# Altium schematic symbol library THU VIEN SCH.SchLib: 1083 symbols (part 1 of 5) (continued)
## De Pin (continued)
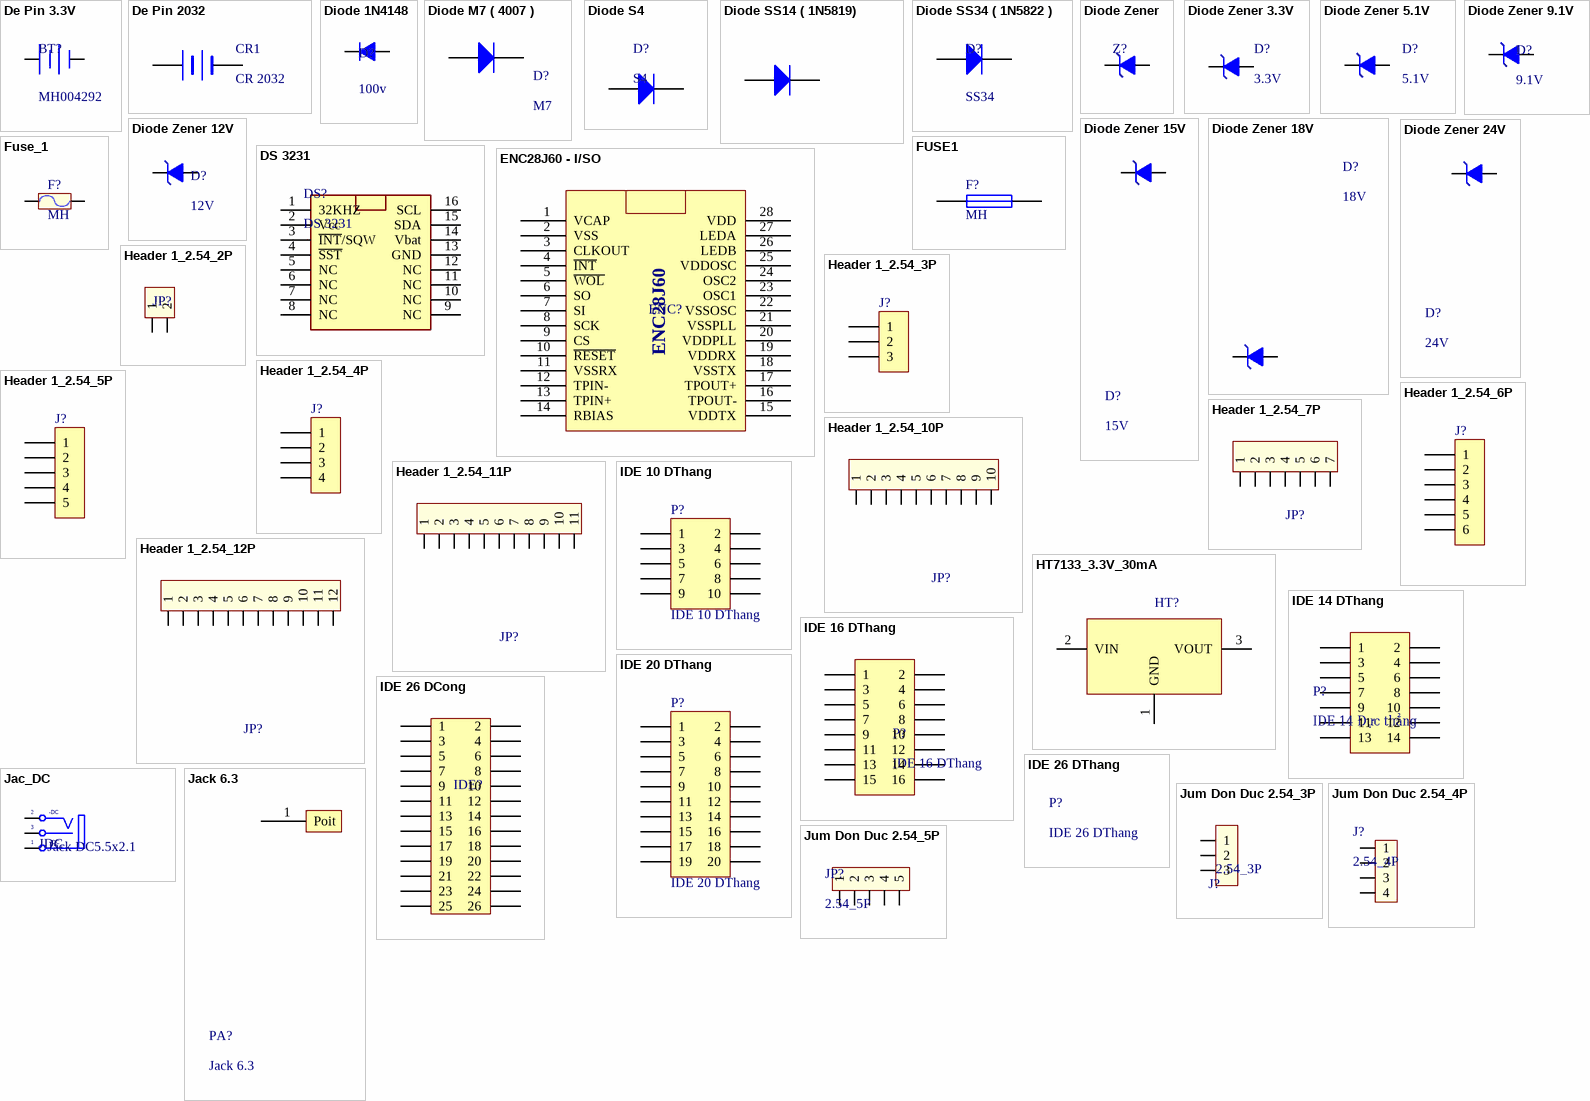
[diagram p3: symbols De Pin 3.3V to Jum Don Duc 2.54_5P]

## De Pin 3.3V
designator BT?, comment MH004292
Dán; LatestRevisionDate: Đế Pin CR2032 SMD003
footprint PIN CR1220
pins: 1 +, 2 -

## De Pin 2032
designator CR1, comment CR 2032
Cắm; Don_Vi: Con; Ma_Hang: MH004286; Ten_Linh_Kien: Đế Pin CR2032 DIP002; Kieu_Chan: *; Ghi_Chu: *; Chung_Loai: Cắm
footprint De Pin CR 2032
pins: 1 -, 2 +

## Diode 1N4148
designator D?, comment 100v
Cắm; Ten_Linh_Kien: Diode 1N4148 DO35 450mA 100V ( 1N4148 DIP); Don_Vi: Con; Ma_Hang: MH001065; Ghi Chu: *; Kieu_Chan: *; Chung_Loai: Cắm
footprint Diode 1N4007 (Diode 2A)
pins: 1 A, 2 K

## Diode M7 ( 4007 )
designator D?, comment M7
Dán; Don_Vi: Con; Ten_Linh_Kien: Diode M7 1N4007 SMD 1A 1000V; Ma_Hang: MH000944; Chung_Loai: Dán; Ghi_Chu: *
footprint DO_SMD_NEW
pins: 1 A, 2 K

## Diode S4
designator D?, comment S4
Dán; Ten_Linh_Kien: Diode S4 SOD123 ( 1N5819 SOD123); Ma_Hang: MH005519; Don_Vi: Con; Ghi_Chu: *; Chung_Loai: Dán; Kieu_Chan: *
footprint DIODE S4
pins: 1 A, 2 K

## Diode SS14 ( 1N5819)
designator D?, comment SS14
Dán; Ma_Hang: MH002211; Don_Vi: Con; Ten_Linh_Kien: Diode SS14 DO214 Schottky 1A 40V ( 1N5819 DO214); Chung_Loai: Dán; Ghi_Chu: *; Kieu_Chan: *
footprint DIODE SMD
pins: 1 A, 2 K

## Diode SS34 ( 1N5822 )
designator D?, comment SS34
Dán; Don_Vi: Con; Ma_Hang: MH002104; Ten_Linh_Kien: Diode SS34 3A 40V SMA ( 1N5822 SS34A); Kieu_Chan: *; Chung_Loai: Dán
footprint DO_SMD_NEW
pins: 1 A, 2 K

## Diode Zener
designator Z?
Dán; Value: Zener; Don_Vi: *; Ghi_Chu: *; Kieu Chan: *; Ma_Hang: *
footprint D1A (Diode 1A, W 100mil, L 350mil)
footprint SMB
pins: 1 A, 2 K

## Diode Zener 3.3V
designator D?, comment 3.3V
Dán; Don_Vi: Con; Ma_Hang: MH002880; Ten_Linh_Kien: Diode Zener 1/2W 3.3V SMD1206 ZMM3.3; Kieu_Chan: *; Ghi_Chu: *; Chung_Loai: Dán
footprint ZENNER SMD
pins: 1 A, 2 K

## Diode Zener 5.1V
designator D?, comment 5.1V
Dán; Ma_Hang: MH002881; Ten_Linh_Kien: Diode Zener 1/2W 5.1V SMD1206 ZMM5.1; Don_Vi: Con; Kieu_Chan: *; Ghi_Chu: *; Chung_Loai: Dán
footprint ZENNER SMD
pins: 1 A, 2 K

## Diode Zener 9.1V
designator D?, comment 9.1V
Dán; Don_Vi: Con; Ma_Hang: MH002882; Ten_Linh_Kien: Diode Zener 1/2W 9.1V SMD1206 ZMM9.1; Ghi_Chu: *; Chung_Loai: Dán; Kieu_Chan: *
footprint ZENNER SMD
pins: 1 A, 2 K

## Diode Zener 12V
designator D?, comment 12V
Dán; Ma_Hang: MH000945; Don_Vi: Con; Ten_Linh_Kien: Diode Zener 1/2W 12V SMD1206 ZMM12; Kieu_Chan: *; Ghi_Chu: *; Chung_Loai: Dán
footprint ZENNER SMD
pins: 1 A, 2 K

## Diode Zener 15V
designator D?, comment 15V
Dán; Don_Vi: Con; Ma_Hang: MH002883; Ten_Linh_Kien: Diode Zener 1/2W 15V SMD1206 ZMM15; Ghi_Chu: *; Chung_Loai: Dán; Kieu_Chan: *
footprint ZENNER SMD
pins: 1 A, 2 K

## Diode Zener 18V
designator D?, comment 18V
Dán; Don_Vi: Con; Ma_Hang: MH002884; Ten_Linh_Kien: Diode Zener 1/2W 18V SMD1206 ZMM18; Chung_Loai: Dán; Ghi_Chu: *; Kieu_Chan: *
footprint ZENNER SMD
pins: 1 A, 2 K

## Diode Zener 24V
designator D?, comment 24V
Cắm; Don_Vi: Con; Ten_Linh_Kien: Diode Zener 1/2W 24V DIP 1N5252B; Ma_Hang: MH002878; Ghi_Chu: *; Kieu_Chan: *; Chung_Loai: Cắm
footprint ZENNER SMD
pins: 1 A, 2 K

## DS 3231
designator DS?
Dán; Ma_Hang: MH002604; Don_Vi: Con; Ten_Linh_Kien: DS3231N SOIC16; Ghi_Chu: *; Chung_Loai: Dán; Kieu_Chan: *
footprint SOP16 (Small Outline; 16 Leads; Body Width 5.6 mm; Pitch 1.27 mm)
footprint SOIC16_M (16-Pin Small Outline Integrated Circuit Package (SOIC16), IPC Low Density)
pins: 1 32KHZ, 2 Vcc, 3 ~{INT}/SQW, 4 ~{SST}, 5 NC, 6 NC, 7 NC, 8 NC, 9 NC, 10 NC, 11 NC, 12 NC, 13 GND, 14 Vbat, 15 SDA, 16 SCL

## ENC28J60 - I/SO
designator ENC?, comment ENC28J60  (value not drawn)
Dán; Value: ENC28J60/SS SSOP28; Don_Vi: Con; Ma_Hang: MH000676; Ghi Chu: *; Kieu Chan: *
footprint SSOP28
pins: 1 VCAP, 2 VSS, 3 CLKOUT, 4 ~{INT}, 5 ~{WOL}, 6 SO, 7 SI, 8 SCK, 9 CS, 10 ~{RESET}, 11 VSSRX, 12 TPIN-, 13 TPIN+, 14 RBIAS, 15 VDDTX, 16 TPOUT-, 17 TPOUT+, 18 VSSTX, 19 VDDRX, 20 VDDPLL, 21 VSSPLL, 22 VSSOSC, 23 OSC1, 24 OSC2, 25 VDDOSC, 26 LEDB, 27 LEDA, 28 VDD

## FUSE1
designator F?, comment MH
Cắm; Value: *
pins: 1, 2

## Fuse_1
designator F?, comment MH
Dán; Value: Fuse
footprint Fuse (3A)
footprint FUSE1 (De Fuse Box)
footprint FUSE2 (Fuse)
footprint CAU TRI (Cau Tri)
pins: 1, 2

## Header 1_2.54_2P
designator JP?
Cắm; Chung_Loai: Cắm
footprint Header_Duc Cong_2P 2.54
pins: 1, 2

## Header 1_2.54_3P
designator J?
Cắm; Ma_Hang: *; Ghi_Chu: *; Don_Vi: *; Kieu_Chan: *; Chung_Loai: Cắm
footprint Header_Duc Cong_3P 2.54
pins: 1, 2, 3

## Header 1_2.54_4P
designator J?
Cắm; Chung_Loai: Cắm
footprint CON4
footprint Header_Duc Cong_4P 2.54
pins: 1, 2, 3, 4

## Header 1_2.54_5P
designator J?
Cắm; Chung_Loai: Cắm
footprint Header_Duc Cong_5P 2.54
pins: 1, 2, 3, 4, 5

## Header 1_2.54_6P
designator J?
Cắm; Don Vi: Con; Chung_Loai: Cắm
footprint Header_Duc Cong_6P 2.54
pins: 1, 2, 3, 4, 5, 6

## Header 1_2.54_7P
designator JP?
Cắm; Don_Vi: Con; Chung_Loai: Cắm
footprint Header_Duc Cong_P 2.54
pins: 1, 2, 3, 4, 5, 6, 7

## Header 1_2.54_10P
designator JP?
Cắm; Don_Vi: Con; Chung_Loai: Cắm
footprint Header_Duc Thang_10P_2.54
pins: 1, 2, 3, 4, 5, 6, 7, 8, 9, 10

## Header 1_2.54_11P
designator JP?
Cắm; Don_Vi: Con; Chung_Loai: Cắm
footprint CON11
pins: 1, 2, 3, 4, 5, 6, 7, 8, 9, 10, 11

## Header 1_2.54_12P
designator JP?
Cắm; Don_Vi: Con; Chung_Loai: Cắm
footprint CON12
pins: 1, 2, 3, 4, 5, 6, 7, 8, 9, 10, 11, 12

## HT7133_3.3V_30mA
designator HT?, comment HT7133 3.3V 30mA  (value not drawn)
footprint SOT89-150P410X160-3N (SOT89, 3-Leads, Body 4.5x2.4mm (max), Pitch 1.50mm, Lead Span 4.1mm, IPC Medium Density)
pins: 1 GND, 2 VIN, 3 VOUT

## IDE 10 DThang
designator P?
Cắm; Don_Vi: Con; Chung_Loai: Cắm; Kieu_Chan: *; Ghi_Chu: *
footprint IDE 10 (Connector; Header; 5x2 Position)
signal-integrity model Connector
pins: 1, 2, 3, 4, 5, 6, 7, 8, 9, 10

## IDE 14 DThang
designator P?, comment IDE 14 Đực thẳng
Cắm; Ghi_Chu: Con; Ma_Hang: MH001326; Ten_Linh_Kien: IDE14 Đực Thẳng 2.54MM; Kieu_Chan: *; Don_Vi: *; Chung_Loai: Cắm
footprint IDE_14P
pins: 1, 2, 3, 4, 5, 6, 7, 8, 9, 10, 11, 12, 13, 14

## IDE 16 DThang
designator P?
Cắm; Don_Vi: Con; Ten_Linh_Kien: *; Kieu_Chan: *; Chung_Loai: Cắm; Ghi_Chu: *; Ma_Hang: *
pins: 1, 2, 3, 4, 5, 6, 7, 8, 9, 10, 11, 12, 13, 14, 15, 16

## IDE 20 DThang
designator P?
Cắm; Don_Vi: Con; Chung_Loai: Cắm; Ma_Hang: *; Kieu_Chan: *; Ghi_Chu: *; Ten_Linh_Kien: *
footprint IDE20 (Connector; Header; 5x2 Position)
signal-integrity model Connector
pins: 1, 2, 3, 4, 5, 6, 7, 8, 9, 10, 11, 12, 13, 14, 15, 16, 17, 18, 19, 20

## IDE 26 DCong
designator IDE?, comment IDE26 Đực Cong 2.54MM  (value not drawn)
Cắm; Don_Vi: Con; Ma_Hang: MH004691; Ten_Linh_Kien: IDE26 Đực Cong 2.54MM; Kieu_Chan: *; Ghi_Chu: *; Chung_Loai: Cắm
pins: 1, 2, 3, 4, 5, 6, 7, 8, 9, 10, 11, 12, 13, 14, 15, 16, 17, 18, 19, 20, 21, 22, 23, 24, 25, 26

## IDE 26 DThang
designator P?
Cắm; Ten_Linh_Kien: IDE26 Đực Thẳng 2.54MM; Don_Vi: Con; Ma_Hang: MH004532; Ghi_Chu: *; Chung_Loai: Cắm; Kieu_Chan: *
footprint IDE 26

## Jac_DC
designator JDC, comment Jack DC5.5x2.1
Cắm; Ten_Linh_Kien: Jack DC5.5x2.1MM DC5501; Ma_Hang: MH000923; Don_Vi: Con; Kieu_Chan: *; Ghi_Chu: *; Chung_Loai: Cắm
footprint DC-IN (Jac DC input)
pins: 1 T "Tip", 2 TN "Tip Normal (Break Contact)", 3 S (power) "Sleeve (Ground)"
text: -DC; +DC

## Jack 6.3
designator PA?
footprint Jack 6.3
pins: 1 Poit

## Jum Don Duc 2.54_3P
designator J?, comment 2.54_3P
Cắm; Ten_Linh_Kien: Jump Đơn Đực 2.54MM 1x40P Thẳng 11MM; Ma_Hang: MH000903; Don_Vi: Con; Kieu_Chan: *; Ghi_Chu: *; Chung_Loai: Cắm
footprint JP3 (Jumper 3)
pins: 1, 2, 3

## Jum Don Duc 2.54_4P
designator J?, comment 2.54_4P
Cắm; Don_Vi: Con; Ma_Hang: MH000903; Value: Jump Đơn Đực 2.54MM 1x40P Thẳng 11MM; Ghi Chu: *; Kieu Chan: *; Chung_Loai: Cắm
footprint JP4 (Jumper 4)
footprint JP4H
pins: 1, 2, 3, 4

## Jum Don Duc 2.54_5P
designator JP?, comment 2.54_5P
Cắm; Ten_Linh_Kien: Jump Đôi Đực 2.54MM 2x40P Thẳng 11MM; Don_Vi: Con; Ma_Hang: MH000903; Kieu_Chan: *; Ghi_Chu: *; Chung_Loai: Cắm
footprint JP5
footprint JP5H
pins: 1, 2, 3, 4, 5

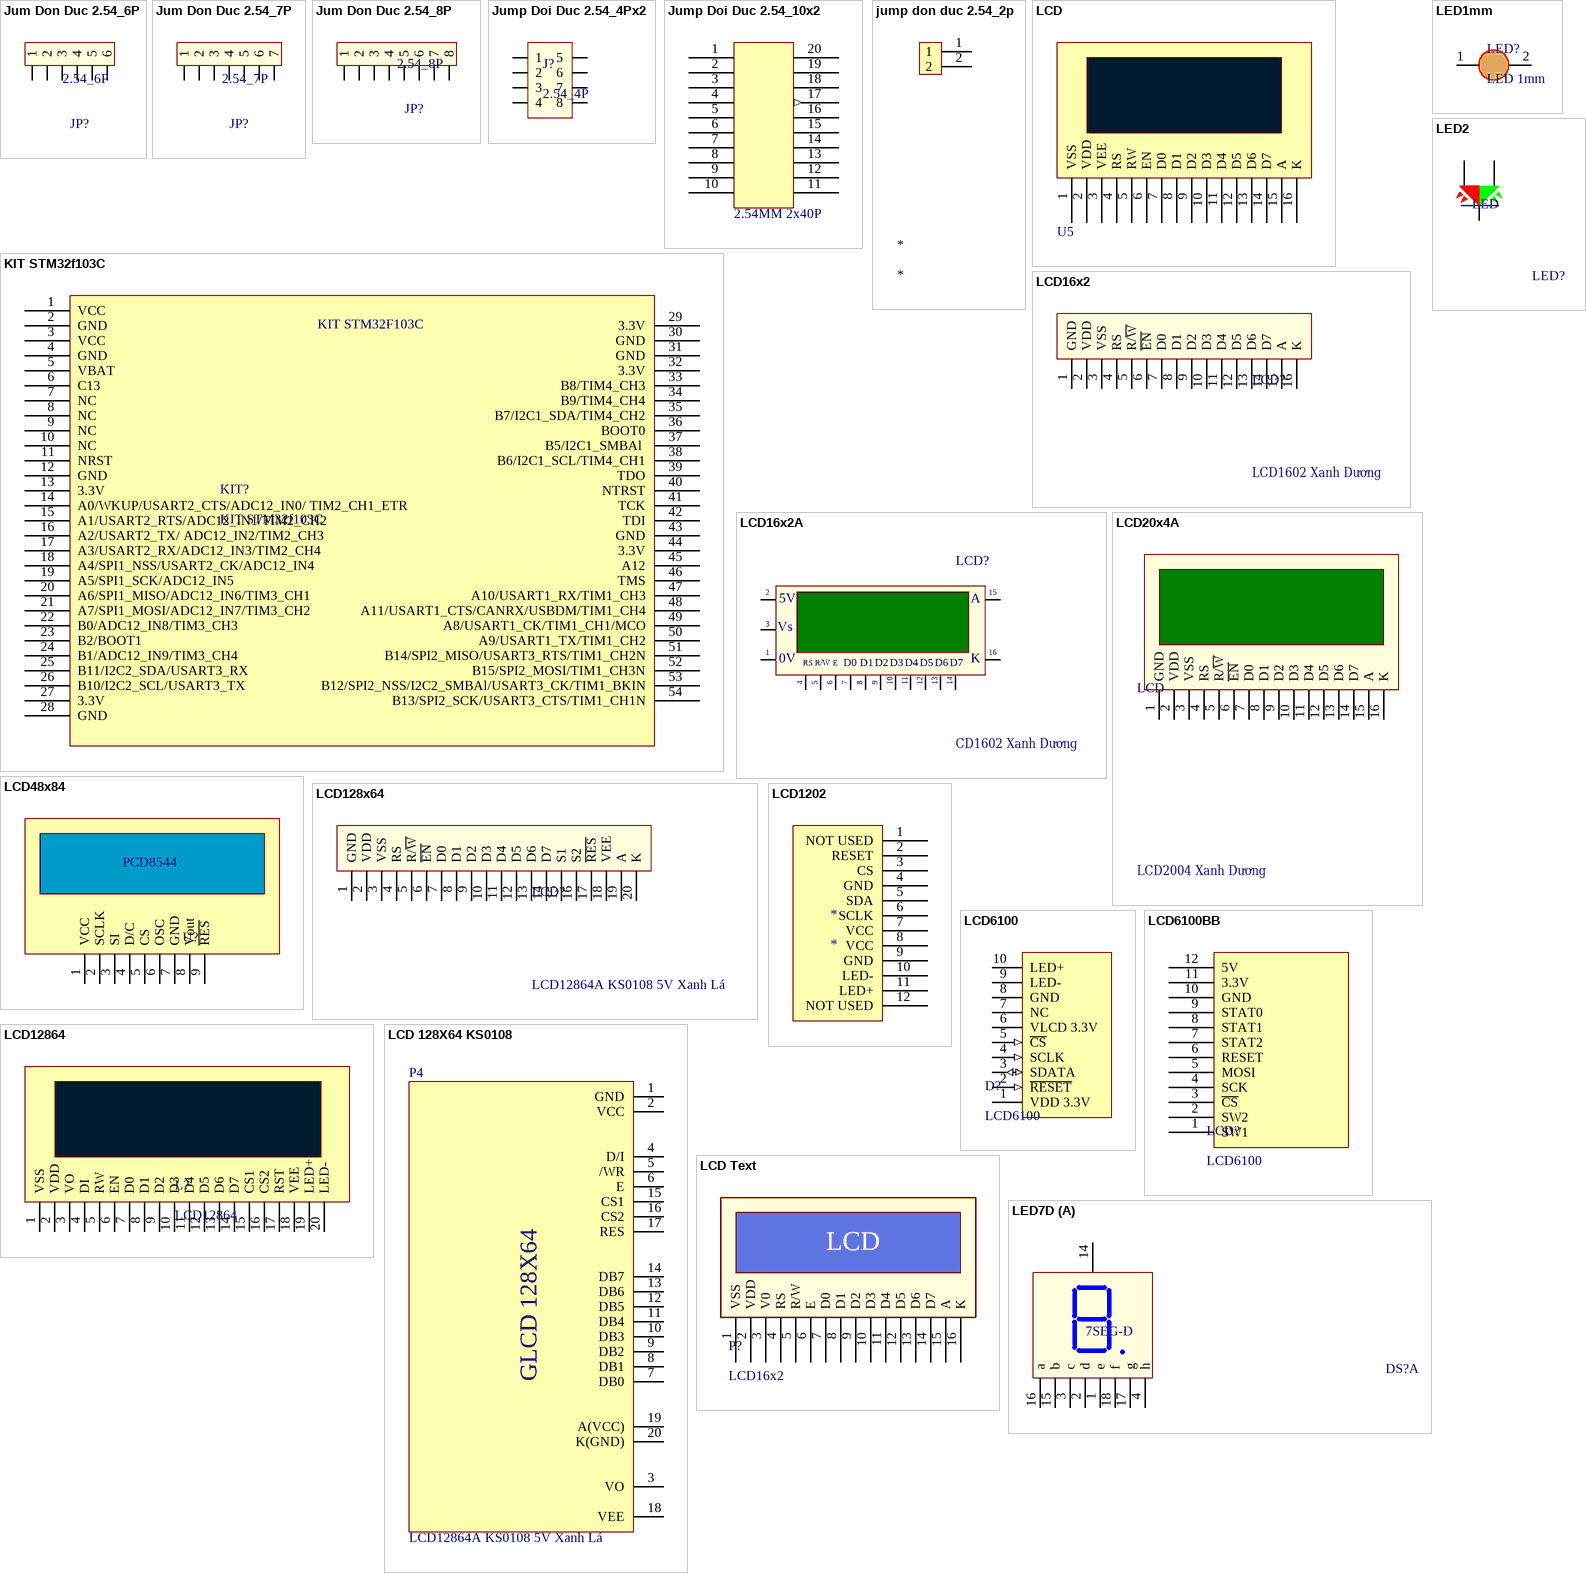
[diagram p4: symbols Jum Don Duc 2.54_6P to LED7D]

## Jum Don Duc 2.54_6P
designator JP?, comment 2.54_6P
Cắm; Ten_Linh_Kien: Jump Đơn Đực 2.54MM 1x40P Thẳng 11MM; Ma_Hang: MH000903; Don_Vi: Con; Kieu_Chan: *; Ghi_Chu: *; Chung_Loai: Cắm
footprint JP6
footprint JP6H
pins: 1, 2, 3, 4, 5, 6

## Jum Don Duc 2.54_7P
designator JP?, comment 2.54_7P
Cắm; Ten_Linh_Kien: Jump Đơn Đực 2.54MM 1x40P Thẳng 11MM; Ma_Hang: MH000903; Don_Vi: Con; Ghi Chu: *; Kieu Chan: *; Chung_Loai: Cắm
footprint JP7
footprint JP7H
pins: 1, 2, 3, 4, 5, 6, 7

## Jum Don Duc 2.54_8P
designator JP?, comment 2.54_8P
Cắm; Value: Jump Đơn Đực 2.54MM 1x40P Thẳng 11MM; Ma_Hang: MH000903; Don_Vi: Con; Ghi_Chu: *; Kieu Chan: *; Chung_Loai: Cắm
footprint JP8
footprint JP8H
pins: 1, 2, 3, 4, 5, 6, 7, 8

## Jump Doi Duc 2.54_4Px2
designator J?, comment 2.54_4P
Cắm; Ten_Linh_Kien: Jump Đơn Đực 2.54MM 1x40P Thẳng 11MM; Ma_Hang: MH000903; Don_Vi: Con; Ghi_Chu: *; Kieu_Chan: *; Chung_Loai: Cắm
footprint JP4x2 (Connector 4x2)
pins: 1, 2, 3, 4, 5, 6, 7, 8

## Jump Doi Duc 2.54_10x2
designator JP?, comment 2.54MM 2x40P
Cắm; Ten_Linh_Kien: Jump Đôi Đực 2.54MM 2x40P Thẳng 11MM; Don_Vi: Con; Ma_Hang: MH002686; Ghi_Chu: *; Kieu_Chan: *; Chung_Loai: Cắm
footprint HDR2X10
pins: 1, 2, 3, 4, 5, 6, 7, 8, 9, 10, 11 13, 12 14, 13 15, 14 16, 15 17, 16 18, 17 19 (out), 18 20, 19 21, 20 22

## jump don duc 2.54_2p
designator *
footprint jump don duc_2p
pins: 1, 2

## KIT STM32f103C
designator KIT?
pins: 1 VCC, 2 GND, 3 VCC, 4 GND, 5 VBAT, 6 C13, 7 NC, 8 NC, 9 NC, 10 NC, 11 NRST, 12 GND, 13 3.3V, 14 A0/WKUP/USART2_CTS/ADC12_IN0/ TIM2_CH1_ETR, 15 A1/USART2_RTS/ADC12_IN1/TIM2_CH2, 16 A2/USART2_TX/ ADC12_IN2/TIM2_CH3, 17 A3/USART2_RX/ADC12_IN3/TIM2_CH4, 18 A4/SPI1_NSS/USART2_CK/ADC12_IN4, 19 A5/SPI1_SCK/ADC12_IN5, 20 A6/SPI1_MISO/ADC12_IN6/TIM3_CH1, 21 A7/SPI1_MOSI/ADC12_IN7/TIM3_CH2, 22 B0/ADC12_IN8/TIM3_CH3, 23 B2/BOOT1, 24 B1/ADC12_IN9/TIM3_CH4, 25 B11/I2C2_SDA/USART3_RX, 26 B10/I2C2_SCL/USART3_TX, 27 3.3V, 28 GND, 29 3.3V, 30 GND, 31 GND, 32 3.3V, 33 B8/TIM4_CH3, 34 B9/TIM4_CH4, 35 B7/I2C1_SDA/TIM4_CH2, 36 BOOT0, 37 B5/I2C1_SMBAl , 38 B6/I2C1_SCL/TIM4_CH1, 39 TDO, 40 NTRST, 41 TCK, 42 TDI, 43 GND, 44 3.3V, 45 A12, 46 TMS, 47 A10/USART1_RX/TIM1_CH3, 48 A11/USART1_CTS/CANRX/USBDM/TIM1_CH4, 49 A8/USART1_CK/TIM1_CH1/MCO, 50 A9/USART1_TX/TIM1_CH2, 51 B14/SPI2_MISO/USART3_RTS/TIM1_CH2N, 52 B15/SPI2_MOSI/TIM1_CH3N, 53 B12/SPI2_NSS/I2C2_SMBAl/USART3_CK/TIM1_BKIN, 54 B13/SPI2_SCK/USART3_CTS/TIM1_CH1N

## LCD
designator U5  (value not drawn)
Value: LCD16x2
footprint LCD 16x2
pins: 1 VSS, 2 VDD, 3 VEE, 4 RS, 5 RW, 6 EN, 7 D0, 8 D1, 9 D2, 10 D3, 11 D4, 12 D5, 13 D6, 14 D7, 15 A, 16 K

## LCD16x2
designator LCD?, comment LCD1602 Xanh Dương
Cắm; Ten_Linh_Kien: LCD1602 Xanh Dương ( Điện Áp 3.3V); Don_Vi: Con; Ma_Hang: MH002827; Kieu_Chan: *; Ghi_Chu: *; Chung_Loai: Cắm
footprint LCD16X2N (LCD dipslay 16x2, 16 pin)
footprint LCD16X2 (LCD dipslay 16x2, 16 pin)
pins: 1 GND, 2 VDD, 3 VSS, 4 RS, 5 R/~{W}, 6 ~{EN}, 7 D0, 8 D1, 9 D2, 10 D3, 11 D4, 12 D5, 13 D6, 14 D7, 15 A, 16 K

## LCD16x2A
designator LCD?, comment CD1602 Xanh Dương
Cắm; Ten_Linh_Kien: CD1602 Xanh Dương ( Điện Áp 3.3V); Ma_Hang: MH002827; Don_Vi: Con; Kieu_Chan: *; Ghi _Chu: *; Chung_Loai: Cắm
footprint LCD16X2 (LCD dipslay 16x2, 16 pin)
footprint LCD16X2N (LCD dipslay 16x2, 16 pin)
pins: 1 GND, 2 VDD, 3 VEE, 4 RS, 5 R/~{W}, 6 ~{EN}, 7 D0, 8 D1, 9 D2, 10 D3, 11 D4, 12 D5, 13 D6, 14 D7, 15 A, 16 K
text: 5V; Vs; |; 0V; R/W; E

## LCD20x4A
designator LCD, comment LCD2004 Xanh Dương
Cắm; Ma_Hang: MH001144; Don_Vi: Con; Ten_Linh_Kien: LCD2004 Xanh Dương; Ghi _Chu: *; Kieu_Chan: *; Chung_Loai: Cắm
footprint LCD20X4A (LCD dipslay 20x4, 16 pin)
pins: 1 GND, 2 VDD, 3 VSS, 4 RS, 5 R/~{W}, 6 ~{EN}, 7 D0, 8 D1, 9 D2, 10 D3, 11 D4, 12 D5, 13 D6, 14 D7, 15 A, 16 K

## LCD48x84
designator U?, comment PCD8544
LCD Graphic; Value: PCD8544
footprint CON9
pins: 1 VCC, 2 SCLK, 3 SI, 4 D/C, 5 CS, 6 OSC, 7 GND, 8 Vout, 9 ~{RES}

## LCD128x64
designator LCD?, comment LCD12864A KS0108 5V Xanh Lá
Cắm; Don_Vi: Con; Ma_Hang: MH003961; Ten_Linh_Kien: LCD12864A KS0108 5V Xanh Lá; Kieu_Chan: *; Ghi_Chu: *; Chung_Loai: Cắm
footprint LCD128x64 (LCD Graphic 128x64, 20 pin)
pins: 1 GND, 2 VDD, 3 VSS, 4 RS, 5 R/~{W}, 6 ~{EN}, 7 D0, 8 D1, 9 D2, 10 D3, 11 D4, 12 D5, 13 D6, 14 D7, 15 S1, 16 S2, 17 ~{RES}, 18 VEE, 19 A, 20 K

## LCD1202
designator *
footprint LCD_1202
pins: 1 NOT USED, 2 RESET, 3 CS, 4 GND, 5 SDA, 6 SCLK, 7 VCC, 8 VCC, 9 GND, 10 LED-, 11 LED+, 12 NOT USED

## LCD6100
designator D?
GLCD 132 pixel x 132 pixel - 4096 color
pins: 1 VDD 3.3V (power), 2 ~{RESET} (in), 3 SDATA (io), 4 SCLK (in), 5 ~{CS} (in), 6 VLCD 3.3V (power), 7 NC, 8 GND (power), 9 LED- (power), 10 LED+ (power)

## LCD6100BB
designator LCD?, comment LCD6100
footprint HDR1X12 (Connector; Header; 12 Position)
pins: 1 SW1, 2 SW2, 3 ~{CS}, 4 SCK, 5 MOSI, 6 RESET, 7 STAT2, 8 STAT1, 9 STAT0, 10 GND, 11 3.3V, 12 5V

## LCD12864
designator L?
footprint LCD12864
pins: 1 VSS, 2 VDD, 3 VO, 4 DI, 5 RW, 6 EN, 7 D0, 8 D1, 9 D2, 10 D3, 11 D4, 12 D5, 13 D6, 14 D7, 15 CS1, 16 CS2, 17 RST, 18 VEE, 19 LED+, 20 LED-

## LCD 128X64 KS0108
designator P4, comment LCD12864A KS0108 5V Xanh Lá
Cắm; Ma_Hang: MH003961; Don_Vi: Con; Ten_Linh_Kien: LCD12864A KS0108 5V Xanh Lá; Kieu_Chan: *; Ghi_Chu: *; Chung_Loai: Cắm
footprint LCD128x64 (Footprint not found)
pins: 1 GND, 2 VCC, 3 VO, 4 D/I, 5 /WR, 6 E, 7 DB0, 8 DB1, 9 DB2, 10 DB3, 11 DB4, 12 DB5, 13 DB6, 14 DB7, 15 CS1, 16 CS2, 17 RES, 18 VEE, 19 A(VCC), 20 K(GND)
2 alternate drawings of the same symbol
text: GLCD 128X64

## LCD Text
designator P?, comment LCD16x2
footprint LCD16X2 (LCD 16x2)
footprint HDR1X16 (Connector; Header; 16 Position)
pins: 1 VSS, 2 VDD, 3 V0, 4 RS, 5 R/W, 6 E, 7 D0, 8 D1, 9 D2, 10 D3, 11 D4, 12 D5, 13 D6, 14 D7, 15 A, 16 K
text: LCD

## LED1mm
designator LED?, comment LED 1mm
footprint HDR1X2
pins: 1 A, 2 K

## LED2
designator LED?, comment LED
LED 2 colour Green and Red; Value: LED 3 - 5 ly 2 Colour
footprint LED-32 (LED 3 PIN, 3ly Two colour)
footprint LED-52 (LED 3 PIN, 5 ly , Two colour)
pins: 1, 2, 3
